# Altium footprint library AMLB_v1.PcbLib: 147 footprints (part 4 of 10)
Each footprint in its own frame and in the unit in brackets; x right, y up, seen from the top. Pads: shape width x height; smd on the part's side, far side on the other; paste and mask are expansions set on the pad; w line width, h text height; cw(c..) or ccw(c..) is an arc to the next point about the centre after c.
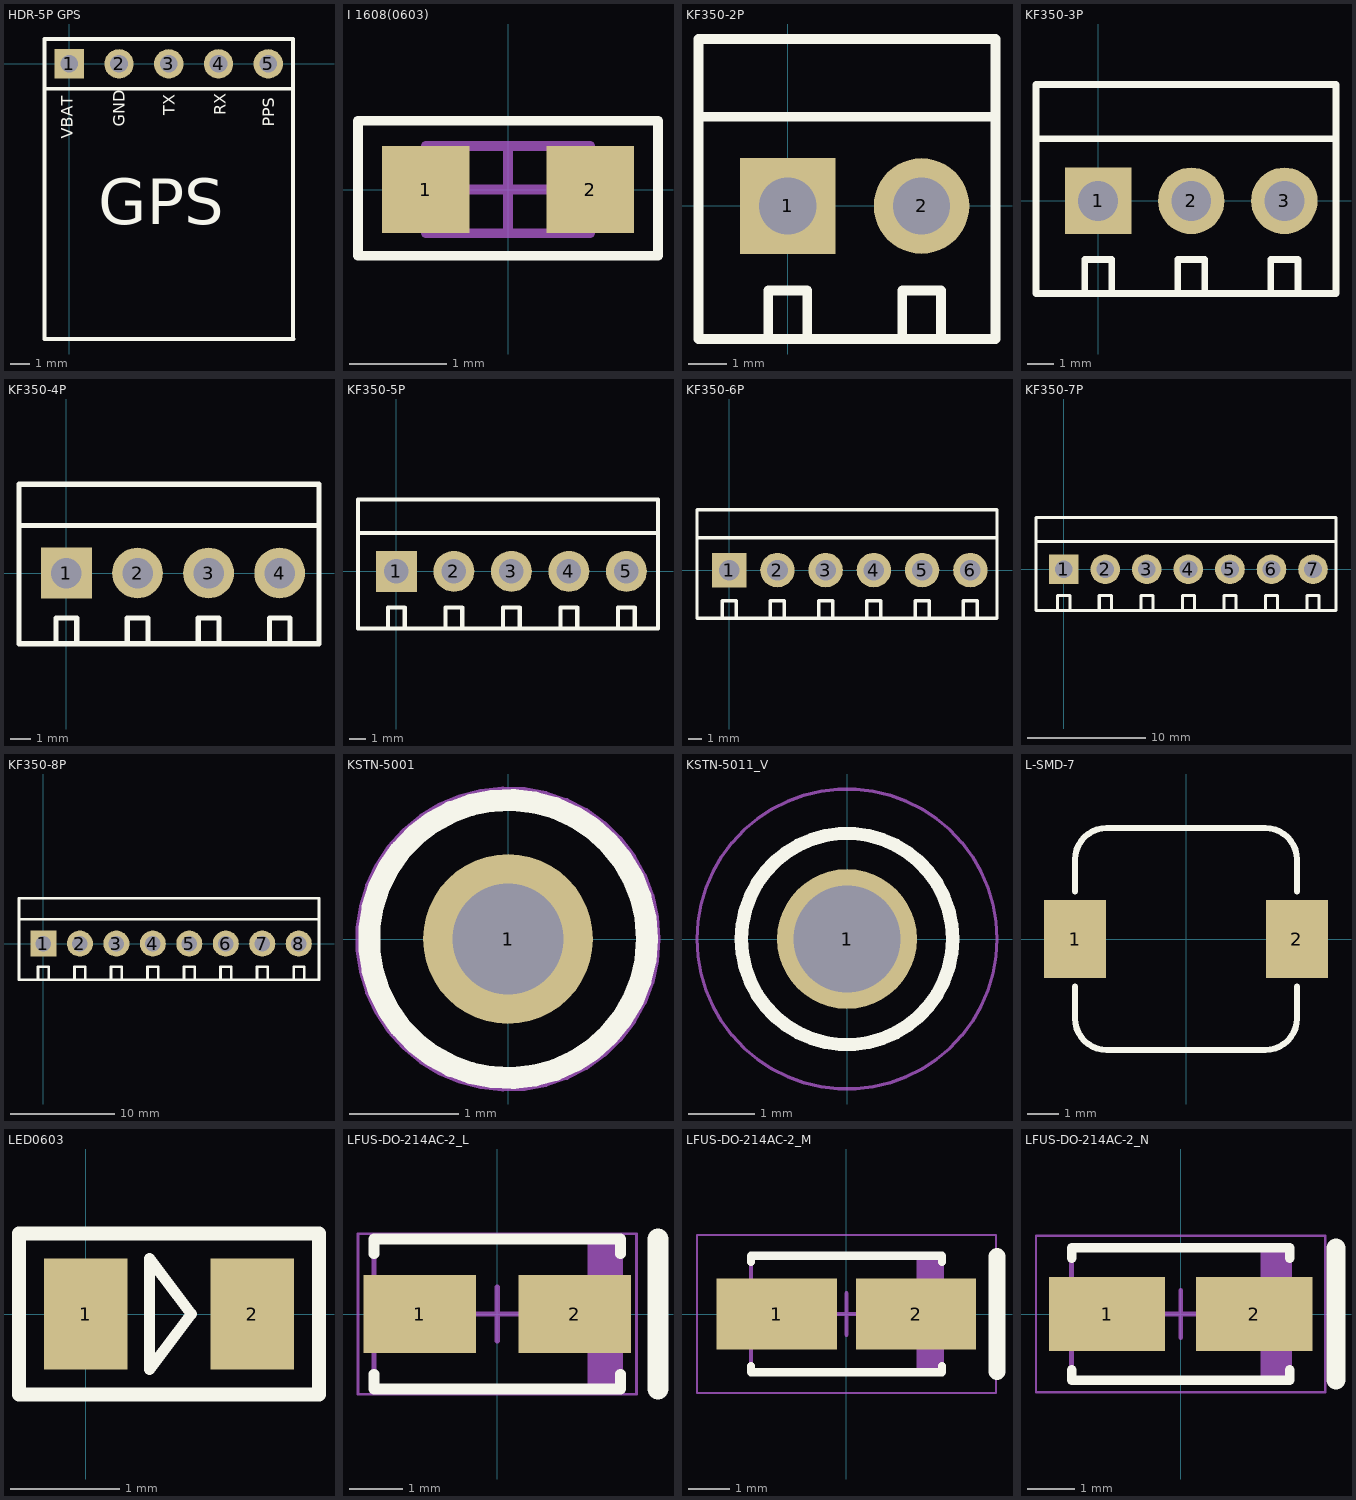
[diagram p3: the footprints below, top view; thin cyan lines are the x and y axes]

## HDR-5P GPS [mm] "Connector; Header; 5 Position"
height 10
pads (5):
  rect 1.5x1.5 hole 0.9: 1(0,0)
  round 1.5 hole 0.9: 2(2.54,0) 3(5.08,0) 4(7.62,0) 5(10.16,0)
Top Overlay:
  lines w0.2: -1.27,-1.143 -1.27,-14.046 11.455,-14.046 ; 11.43,-14.046 11.43,-1.041 ; -1.27,-1.27 11.43,-1.27 11.43,1.27 -1.27,1.27 -1.27,-1.27
  text "GPS" at 1.473,-8.966 h4
  text "VBAT" at 0.178,-3.81 h0.6
  text "GND" at 2.845,-3.21 h0.6
  text "TX" at 5.385,-2.61 h0.6
  text "RX" at 8.001,-2.61 h0.6
  text "PPS" at 10.465,-3.21 h0.6
3D body "HDR2.54-1P_M.STEP": height 8.5, standoff -3, extent 8.89,-1.27 11.43,1.27
3D body "HDR2.54-1P_M.STEP": height 8.5, standoff -3, extent 3.81,-1.27 6.35,1.27
3D body "HDR2.54-1P_M.STEP": height 8.5, standoff -3, extent 6.35,-1.27 8.89,1.27
3D body "HDR2.54-1P_M.STEP": height 8.5, standoff -3, extent -1.27,-1.27 1.27,1.27
3D body "HDR2.54-1P_M.STEP": height 8.5, standoff -3, extent 1.27,-1.27 3.81,1.27

## I 1608(0603) [mm] "Chip Inductance, 2-Leads, Body 1.60x0.80mm, IPC Medium Density"
height 0.6
pads (2):
  rect 0.9x0.9 smd: 1(-0.85,0) 2(0.85,0)
Top Overlay:
  lines w0.1: -1.549,-0.686 -1.549,0.711 1.549,0.711 1.549,-0.686 -1.549,-0.686
Mechanical 13:
  lines w0.1: -0.85,-0.45 0.85,-0.45 0.85,0.45 -0.85,0.45 -0.85,-0.45
Mechanical 15:
  lines w0.05: -1.55,-0.7 1.55,-0.7 1.55,0.7 -1.55,0.7 -1.55,-0.7
  lines w0.1: -0.45,0 0.45,0 ; 0,-0.45 0,0.45
3D body "User Library-V0603HD.STEP": height 0.8, standoff 0, extent -0.825,-0.443 0.775,0.457

## KF350-2P [mm] "可拼接端子/10A"
pads (2):
  rect 2.5x2.5 hole 1.5: 1(0,0)
  round 2.5 hole 1.5: 2(3.5,0)
Top Overlay:
  lines w0.254: -2.337,2.337 5.436,2.337 ; -0.508,-3.48 -0.508,-2.21 0.508,-2.21 0.508,-3.48 ; 2.992,-3.48 2.992,-2.21 4.008,-2.21 4.008,-3.48 ; -2.337,-3.48 5.436,-3.48 5.436,4.369 -2.337,4.369 -2.337,-3.48
3D body "KF350.STEP": height 10, standoff -3.8, extent -2.15,-3.3 1.75,4.2
3D body "KF350.STEP": height 10, standoff -3.8, extent 1.35,-3.3 5.25,4.2

## KF350-3P [mm] "可拼接端子/10A"
pads (3):
  rect 2.5x2.5 hole 1.5: 1(0,0)
  round 2.5 hole 1.5: 2(3.5,0) 3(7,0)
Top Overlay:
  lines w0.254: -2.337,2.337 8.941,2.337 ; -0.508,-3.48 -0.508,-2.21 0.508,-2.21 0.508,-3.48 ; 2.992,-3.48 2.992,-2.21 4.008,-2.21 4.008,-3.48 ; 6.492,-3.48 6.492,-2.21 7.508,-2.21 7.508,-3.48 ; -2.337,-3.48 -2.337,4.369 8.941,4.369 8.941,-3.48 -2.337,-3.48
3D body "KF350.STEP": height 10, standoff -3.8, extent 1.35,-3.3 5.25,4.2
3D body "KF350.STEP": height 10, standoff -3.8, extent -2.15,-3.3 1.75,4.2
3D body "KF350.STEP": height 10, standoff -3.8, extent 4.85,-3.3 8.75,4.2

## KF350-4P [mm] "可拼接端子/10A"
pads (4):
  rect 2.5x2.5 hole 1.5: 1(0,0)
  round 2.5 hole 1.5: 2(3.5,0) 3(7,0) 4(10.5,0)
Top Overlay:
  lines w0.254: -2.337,2.337 12.436,2.337 ; -0.508,-3.48 -0.508,-2.21 0.508,-2.21 0.508,-3.48 ; 2.992,-3.48 2.992,-2.21 4.008,-2.21 4.008,-3.48 ; 6.492,-3.48 6.492,-2.21 7.508,-2.21 7.508,-3.48 ; 9.992,-3.48 9.992,-2.21 11.008,-2.21 11.008,-3.48 ; -2.337,-3.48 12.436,-3.48 12.436,4.369 -2.337,4.369 -2.337,-3.48
3D body "KF350.STEP": height 10, standoff -3.8, extent 8.35,-3.3 12.25,4.2
3D body "KF350.STEP": height 10, standoff -3.8, extent 4.85,-3.3 8.75,4.2
3D body "KF350.STEP": height 10, standoff -3.8, extent 1.35,-3.3 5.25,4.2
3D body "KF350.STEP": height 10, standoff -3.8, extent -2.15,-3.3 1.75,4.2

## KF350-5P [mm] "可拼接端子/10A"
pads (5):
  rect 2.5x2.5 hole 1.5: 1(0,0)
  round 2.5 hole 1.5: 2(3.5,0) 3(7,0) 4(10.5,0) 5(14,0)
Top Overlay:
  lines w0.254: -2.337,2.337 15.926,2.337 ; -0.508,-3.48 -0.508,-2.21 0.508,-2.21 0.508,-3.48 ; 2.992,-3.48 2.992,-2.21 4.008,-2.21 4.008,-3.48 ; 6.492,-3.48 6.492,-2.21 7.508,-2.21 7.508,-3.48 ; 9.992,-3.48 9.992,-2.21 11.008,-2.21 11.008,-3.48 ; 13.492,-3.48 13.492,-2.21 14.508,-2.21 14.508,-3.48 ; -2.337,-3.48 -2.337,4.369 15.926,4.369 15.926,-3.48 -2.337,-3.48
3D body "KF350.STEP": height 10, standoff -3.8, extent -2.15,-3.3 1.75,4.2
3D body "KF350.STEP": height 10, standoff -3.8, extent 1.35,-3.3 5.25,4.2
3D body "KF350.STEP": height 10, standoff -3.8, extent 4.85,-3.3 8.75,4.2
3D body "KF350.STEP": height 10, standoff -3.8, extent 8.35,-3.3 12.25,4.2
3D body "KF350.STEP": height 10, standoff -3.8, extent 11.85,-3.3 15.75,4.2

## KF350-6P [mm] "可拼接端子/10A"
pads (6):
  rect 2.5x2.5 hole 1.5: 1(0,0)
  round 2.5 hole 1.5: 2(3.5,0) 3(7,0) 4(10.5,0) 5(14,0) 6(17.5,0)
Top Overlay:
  lines w0.254: -2.337,2.337 19.41,2.337 ; -0.508,-3.48 -0.508,-2.21 0.508,-2.21 0.508,-3.48 ; 2.992,-3.48 2.992,-2.21 4.008,-2.21 4.008,-3.48 ; 6.492,-3.48 6.492,-2.21 7.508,-2.21 7.508,-3.48 ; 9.992,-3.48 9.992,-2.21 11.008,-2.21 11.008,-3.48 ; 13.492,-3.48 13.492,-2.21 14.508,-2.21 14.508,-3.48 ; 16.993,-3.48 16.993,-2.21 18.009,-2.21 18.009,-3.48 ; -2.337,-3.48 -2.337,4.369 19.436,4.369 19.436,-3.48 -2.337,-3.48
3D body "KF350.STEP": height 10, standoff -3.8, extent 15.35,-3.3 19.25,4.2
3D body "KF350.STEP": height 10, standoff -3.8, extent 11.85,-3.3 15.75,4.2
3D body "KF350.STEP": height 10, standoff -3.8, extent 8.35,-3.3 12.25,4.2
3D body "KF350.STEP": height 10, standoff -3.8, extent 4.85,-3.3 8.75,4.2
3D body "KF350.STEP": height 10, standoff -3.8, extent 1.35,-3.3 5.25,4.2
3D body "KF350.STEP": height 10, standoff -3.8, extent -2.15,-3.3 1.75,4.2

## KF350-7P [mm] "可拼接端子/10A"
pads (7):
  rect 2.5x2.5 hole 1.5: 1(0,0)
  round 2.5 hole 1.5: 2(3.5,0) 3(7,0) 4(10.5,0) 5(14,0) 6(17.5,0) 7(21,0)
Top Overlay:
  lines w0.254: -2.337,2.337 22.936,2.337 ; -0.508,-3.48 -0.508,-2.21 0.508,-2.21 0.508,-3.48 ; 2.992,-3.48 2.992,-2.21 4.008,-2.21 4.008,-3.48 ; 6.492,-3.48 6.492,-2.21 7.508,-2.21 7.508,-3.48 ; 9.992,-3.48 9.992,-2.21 11.008,-2.21 11.008,-3.48 ; 13.492,-3.48 13.492,-2.21 14.508,-2.21 14.508,-3.48 ; 16.993,-3.48 16.993,-2.21 18.009,-2.21 18.009,-3.48 ; 20.498,-3.48 20.498,-2.21 21.514,-2.21 21.514,-3.48 ; -2.337,-3.48 22.936,-3.48 22.936,4.369 -2.337,4.369 -2.337,-3.48
3D body "KF350.STEP": height 10, standoff -3.8, extent 18.85,-3.3 22.75,4.2
3D body "KF350.STEP": height 10, standoff -3.8, extent 15.35,-3.3 19.25,4.2
3D body "KF350.STEP": height 10, standoff -3.8, extent 11.85,-3.3 15.75,4.2
3D body "KF350.STEP": height 10, standoff -3.8, extent 8.35,-3.3 12.25,4.2
3D body "KF350.STEP": height 10, standoff -3.8, extent 4.85,-3.3 8.75,4.2
3D body "KF350.STEP": height 10, standoff -3.8, extent 1.35,-3.3 5.25,4.2
3D body "KF350.STEP": height 10, standoff -3.8, extent -2.15,-3.3 1.75,4.2

## KF350-8P [mm] "可拼接端子/10A"
pads (8):
  rect 2.5x2.5 hole 1.5: 1(0,0)
  round 2.5 hole 1.5: 2(3.5,0) 3(7,0) 4(10.5,0) 5(14,0) 6(17.5,0) 7(21,0) 8(24.5,0)
Top Overlay:
  lines w0.254: -2.337,2.337 26.441,2.337 ; -0.508,-3.48 -0.508,-2.21 0.508,-2.21 0.508,-3.48 ; 2.992,-3.48 2.992,-2.21 4.008,-2.21 4.008,-3.48 ; 6.492,-3.48 6.492,-2.21 7.508,-2.21 7.508,-3.48 ; 9.992,-3.48 9.992,-2.21 11.008,-2.21 11.008,-3.48 ; 13.492,-3.48 13.492,-2.21 14.508,-2.21 14.508,-3.48 ; 16.993,-3.48 16.993,-2.21 18.009,-2.21 18.009,-3.48 ; 20.498,-3.48 20.498,-2.21 21.514,-2.21 21.514,-3.48 ; 24.003,-3.48 24.003,-2.21 25.019,-2.21 25.019,-3.48 ; -2.337,-3.48 26.441,-3.48 26.441,4.369 -2.337,4.369 -2.337,-3.48
3D body "KF350.STEP": height 10, standoff -3.8, extent 22.35,-3.3 26.25,4.2
3D body "KF350.STEP": height 10, standoff -3.8, extent 18.85,-3.3 22.75,4.2
3D body "KF350.STEP": height 10, standoff -3.8, extent 15.35,-3.3 19.25,4.2
3D body "KF350.STEP": height 10, standoff -3.8, extent 11.85,-3.3 15.75,4.2
3D body "KF350.STEP": height 10, standoff -3.8, extent 8.35,-3.3 12.25,4.2
3D body "KF350.STEP": height 10, standoff -3.8, extent 4.85,-3.3 8.75,4.2
3D body "KF350.STEP": height 10, standoff -3.8, extent 1.35,-3.3 5.25,4.2
3D body "KF350.STEP": height 10, standoff -3.8, extent -2.15,-3.3 1.75,4.2

## KSTN-5001 [mm] "Test Point, Through Hole, Dia 2.54mm"
height 4.57
pads (1):
  round 1.55 hole 1.016: 1(0,0)
Top Overlay:
  circle w0.2: c0,0 r1.27
Mechanical 13:
  circle w0.1: c0,0 r1.27
Mechanical 15:
  circle w0.05: c0,0 r1.37
  lines w0.1: -0.5,0 0.5,0 -0.5,0 ; 0,-0.5 0,0.5 0,-0.5
3D body "Keystone_5001.stp": height 4.62, standoff -3, extent -1.254,-1.247 1.246,1.253

## KSTN-5011_V [mm] "Test Point, Dia 3.17mm"
height 8.28
pads (1):
  round 2.1 hole 1.6: 1(0,0)
Top Overlay:
  circle w0.2: c0,0 r1.585
Mechanical 13:
  circle w0.1: c0,0 r1.585
Mechanical 15:
  circle w0.05: c0,0 r2.25
  lines w0.1: -0.5,0 0.5,0 ; 0,-0.5 0,0.5
3D body "keystone-PN5011.STEP": height 8.13, standoff -3.17, extent -1.587,-1.587 1.588,1.588

## L-SMD-7 [mm] "贴片电感7*7"
pads (2):
  rect 2x2.5 smd: 1(-3.556,0) 2(3.556,0)
Top Overlay:
  lines w0.2: -3.556,-1.524 -3.556,-2.54 ccw(c-2.54,-2.54) -2.54,-3.556 2.54,-3.556 ccw(c2.54,-2.54) 3.556,-2.54 3.556,-1.524 ; -3.556,1.524 -3.556,2.54 cw(c-2.54,2.54) -2.54,3.556 2.54,3.556 cw(c2.54,2.54) 3.556,2.54 3.556,1.524
3D body: height 4, standoff 0, extent -3.556,-3.556 3.556,3.556

## LED0603 [mil]
pads (2):
  rect 30x40 smd: 1(0,0) 2(60,0)
Top Overlay:
  lines w4: 23.01,-20 23.01,20 38.01,0 23.01,-20
  lines w5: -24,-29 -24,29 84,29 84,-29 -24,-29

## LFUS-DO-214AC-2_L [mm] "Molded Diode, 2-Leads, Body 4.6x2.79mm, IPC High Density"
height 2.29
pads (2):
  rect 2.1x1.45 smd: 1(-1.45,0) 2(1.45,0)
Top Overlay:
  lines w0.2: -2.3,-1.125 -2.3,-1.4 2.3,-1.4 2.3,-1.125 ; -2.3,1.125 -2.3,1.4 2.3,1.4 2.3,1.125
  lines w0.4: 3,-1.395 3,1.395
Mechanical 13:
  rectangle: 1.681,-1.395 2.3,1.395
  lines w0.1: -2.3,-1.395 2.3,-1.395 2.3,1.395 -2.3,1.395 -2.3,-1.395
Mechanical 15:
  lines w0.05: -2.6,-1.5 2.6,-1.5 2.6,1.5 -2.6,1.5 -2.6,-1.5
  lines w0.1: -0.5,0 0.5,0 ; 0,-0.5 0,0.5
3D body "DIOM4326X23L.step": height 2.29, standoff 0, extent -2.52,-1.395 2.52,1.395

## LFUS-DO-214AC-2_M [mm] "Molded Diode, 2-Leads, Body 4.6x2.79mm, IPC Low Density"
height 2.29
pads (2):
  rect 2.9x1.7 smd: 1(-1.675,0) 2(1.675,0)
Top Overlay:
  lines w0.2: -2.3,-1.25 -2.3,-1.4 2.3,-1.4 2.3,-1.25 ; -2.3,1.25 -2.3,1.4 2.3,1.4 2.3,1.25
  lines w0.4: 3.625,-1.395 3.625,1.395
Mechanical 13:
  rectangle: 1.681,-1.395 2.3,1.395
  lines w0.1: -2.3,-1.395 2.3,-1.395 2.3,1.395 -2.3,1.395 -2.3,-1.395
Mechanical 15:
  lines w0.05: -3.6,-1.9 3.6,-1.9 3.6,1.9 -3.6,1.9 -3.6,-1.9
  lines w0.1: -0.5,0 0.5,0 ; 0,-0.5 0,0.5
3D body "DIOM4326X23M.step": height 2.29, standoff 0, extent -2.52,-1.395 2.52,1.395

## LFUS-DO-214AC-2_N [mm] "Molded Diode, 2-Leads, Body 4.6x2.79mm, IPC Medium Density"
height 2.29
pads (2):
  rect 2.45x1.55 smd: 1(-1.55,0) 2(1.55,0)
Top Overlay:
  lines w0.2: -2.3,-1.175 -2.3,-1.4 2.3,-1.4 2.3,-1.175 ; -2.3,1.175 -2.3,1.4 2.3,1.4 2.3,1.175
  lines w0.4: 3.275,-1.395 3.275,1.395
Mechanical 13:
  rectangle: 1.681,-1.395 2.3,1.395
  lines w0.1: -2.3,-1.395 -2.3,1.395 2.3,1.395 2.3,-1.395 -2.3,-1.395
Mechanical 15:
  lines w0.05: -3.05,-1.65 -3.05,1.65 3.05,1.65 3.05,-1.65 -3.05,-1.65
  lines w0.1: -0.5,0 0.5,0 ; 0,-0.5 0,0.5
3D body "DIOM4326X23N.step": height 2.29, standoff 0, extent -2.52,-1.395 2.52,1.395